# Altium footprint library Garbage sort.PcbLib: 33 footprints (part 3 of 3)
Each footprint in its own frame and in the unit in brackets; x right, y up, seen from the top. Pads: shape width x height; smd on the part's side, far side on the other; paste and mask are expansions set on the pad; w line width, h text height; cw(c..) or ccw(c..) is an arc to the next point about the centre after c.
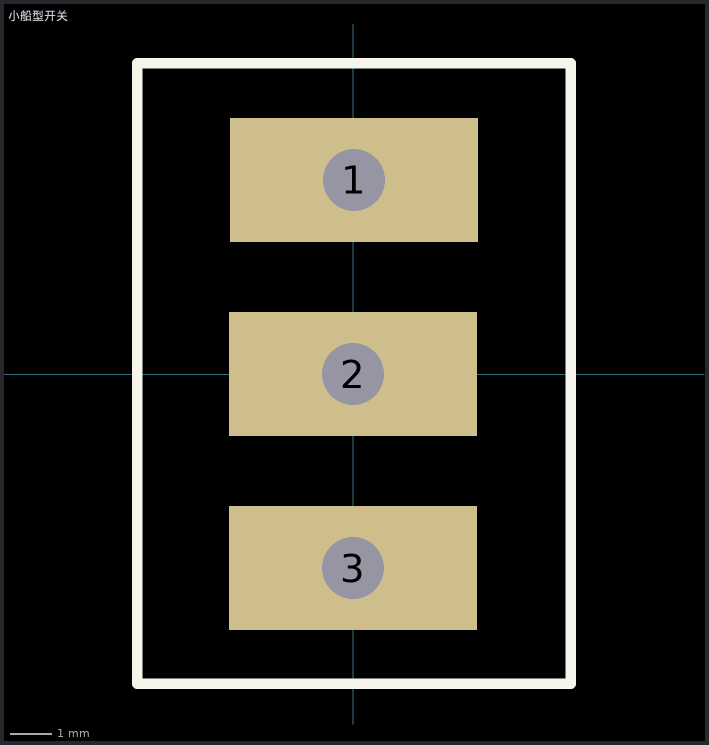
[diagram p2: the footprint, top view; thin cyan lines are the x and y axes]

## 小船型开关 [mm]
pads (3):
  rect 6x3 hole 1.5 square: 1(0.025,4.699) 2(0,0) 3(0,-4.699)
Top Overlay:
  lines w0.254: -5.228,7.507 -5.228,-7.493 5.272,-7.493 5.272,7.518 -5.228,7.518